# Altium footprint library TarabusLibrary.PcbLib: 591 footprints (part 35 of 37)
Each footprint in its own frame and in the unit in brackets; x right, y up, seen from the top. Pads: shape width x height; smd on the part's side, far side on the other; paste and mask are expansions set on the pad; w line width, h text height; cw(c..) or ccw(c..) is an arc to the next point about the centre after c.
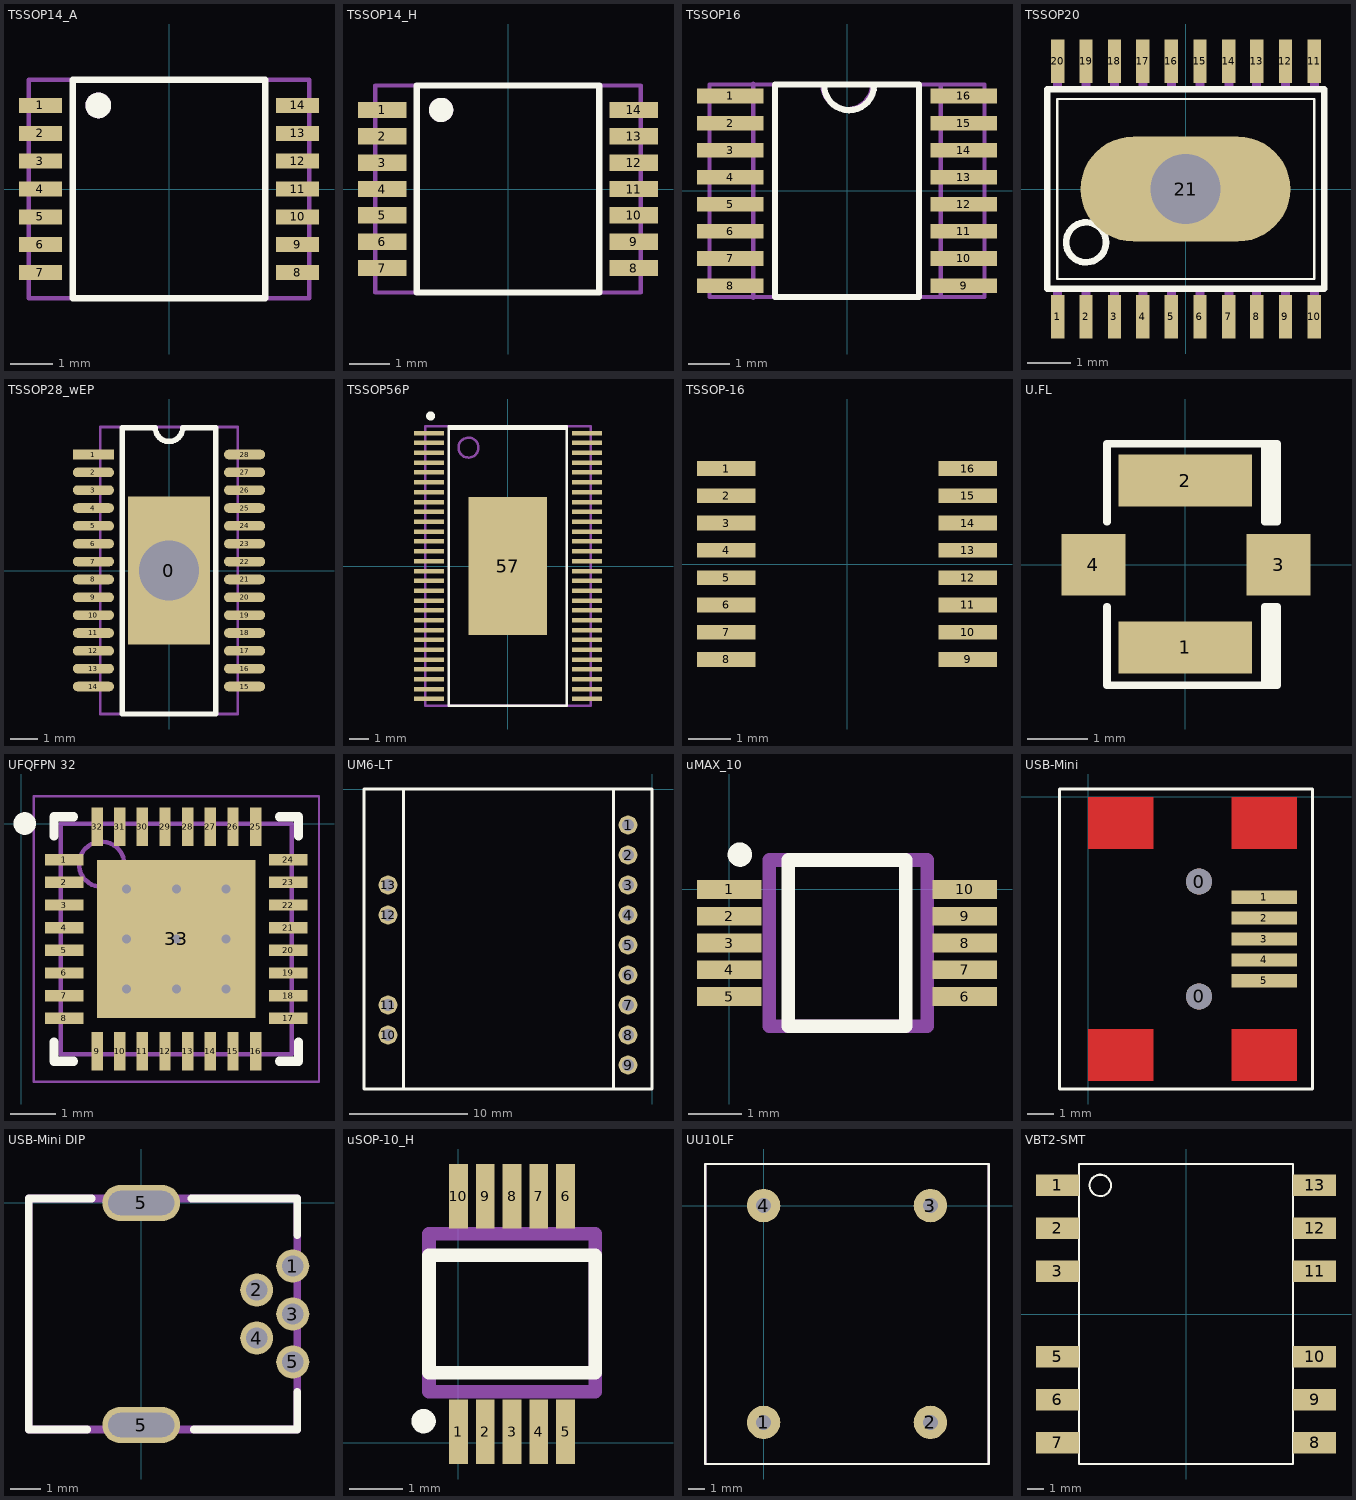
[diagram p34: the footprints below, top view; thin cyan lines are the x and y axes]

## TSSOP14_A [mm]
height 1.1
pads (14):
  rect 1x0.35 smd: 1(-3,1.95) 2(-3,1.3) 3(-3,0.65) 4(-3,0) 5(-3,-0.65) 6(-3,-1.3) 7(-3,-1.95) 8(3,-1.95) 9(3,-1.3) 10(3,-0.65) 11(3,0) 12(3,0.65) 13(3,1.3) 14(3,1.95)
Top Overlay:
  circle w0.3: c-1.65,1.95 r0.15
  lines w0.15: -2.25,-2.55 2.25,-2.55 2.25,2.55 -2.25,2.55 -2.25,-2.55
Mechanical 7:
  circle w0.3: c-1.65,1.95 r0.15
  lines w0.1: -2.25,-2.55 -2.25,2.55 ; 2.25,-2.55 2.25,2.55 ; -3.275,-2.55 -3.275,2.55 3.275,2.55 3.275,-2.55 -3.275,-2.55
Mechanical 10:
  text ".Designator" at -1.2,2.925 h0.8
  text ".Comment" at -1,-3.175 h0.6
3D body: height 1.1, standoff 0, extent -2.25,-2.55 2.25,2.55
3D body: height 0.5, standoff 0, extent -3.275,-2.55 -2.25,2.55
3D body: height 0.5, standoff 0, extent 2.25,-2.55 3.275,2.55

## TSSOP14_H [mm]
height 1.1
pads (14):
  rect 1.2x0.4 smd: 1(-3.1,1.95) 2(-3.1,1.3) 3(-3.1,0.65) 4(-3.1,0) 5(-3.1,-0.65) 6(-3.1,-1.3) 7(-3.1,-1.95) 8(3.1,-1.95) 9(3.1,-1.3) 10(3.1,-0.65) 11(3.1,0) 12(3.1,0.65) 13(3.1,1.3) 14(3.1,1.95)
Top Overlay:
  circle w0.3: c-1.65,1.95 r0.15
  lines w0.15: -2.25,-2.55 -2.25,2.55 2.25,2.55 2.25,-2.55 -2.25,-2.55
Mechanical 7:
  circle w0.3: c-1.65,1.95 r0.15
  lines w0.1: -2.25,-2.55 -2.25,2.55 ; 2.25,-2.55 2.25,2.55 ; -3.275,-2.55 3.275,-2.55 3.275,2.55 -3.275,2.55 -3.275,-2.55
Mechanical 10:
  text ".Comment" at -1,-3.175 h0.6
  text ".Designator" at -1.2,2.925 h0.8
3D body: height 0.5, standoff 0, extent 2.25,-2.55 3.275,2.55
3D body: height 0.5, standoff 0, extent -3.275,-2.55 -2.25,2.55
3D body: height 1.1, standoff 0, extent -2.25,-2.55 2.25,2.55

## TSSOP16 [mm]
height 1.99
pads (16):
  rect 1.6x0.35 smd: 1(-2.8,2.275) 2(-2.8,1.625) 3(-2.8,0.975) 4(-2.8,0.325) 5(-2.8,-0.325) 6(-2.8,-0.975) 7(-2.8,-1.625) 8(-2.8,-2.275) 9(2.8,-2.275) 10(2.8,-1.625) 11(2.8,-0.975) 12(2.8,-0.325) 13(2.8,0.325) 14(2.8,0.975) 15(2.8,1.625) 16(2.8,2.275)
Top Overlay:
  lines w0.15: -0.55,2.535 ccw(c0.05,2.535) 0.65,2.525 ; -1.725,-2.55 -1.725,2.55 1.725,2.55 1.725,-2.55 -1.725,-2.55
Mechanical 7:
  lines w0.1: -2.25,-2.575 -2.25,2.575 ; -0.6,2.56 ccw(c0,2.56) 0.6,2.55 ; 2.25,-2.55 2.25,2.55 ; -3.3,-2.55 -3.3,2.55 3.3,2.55 3.3,-2.55 -3.3,-2.55
Mechanical 10:
  text ".Designator" at -1.23,3.46 h0.8
  text ".Comment" at -0.67,-3.72 h0.6
3D body: height 1.99, standoff 0, extent -2.25,-2.55 2.25,2.525
3D body: height 0.75, standoff 0, extent -3.3,-2.55 -2.25,2.525
3D body: height 0.75, standoff 0, extent 2.25,-2.55 3.3,2.525

## TSSOP20 [mil]
pads (21):
  rect 12x39 smd: 1(-115.16,-114.87) 2(-89.57,-114.87) 3(-63.98,-114.87) 4(-38.39,-114.87) 5(-12.8,-114.87) 6(13,-114.87) 7(39,-114.87) 8(64,-114.87) 9(90,-114.87) 10(116,-114.87) 11(116,115) 12(90,115) 13(64,115) 14(39,115) 15(13,115) 16(-12.8,115) 17(-38.39,115) 18(-63.98,115) 19(-89.57,115) 20(-115.16,115)
  oval 189x94.5 hole 63: 21(0,0)
Top Overlay:
  circle w6: c-89.59,-48 r18
  lines w2: -115.59,-80.87 -115.59,81 116,81 116,-80.87 -115.59,-80.87
  lines w6: -124.59,-89.87 -124.59,90 125,90 125,-89.87 -124.59,-89.87
Mechanical 16:
  rectangle: -119.16,90 -111.16,123
  rectangle: -93.57,90 -85.57,123
  rectangle: -67.98,90 -59.98,123
  rectangle: -42.39,90 -34.39,123
  rectangle: -16.8,90 -8.8,123
  rectangle: 9,90 17,123
  rectangle: 35,90 43,123
  rectangle: 60,90 68,123
  rectangle: 86,90 94,123
  rectangle: 112,90 120,123
  rectangle: 112,-122.87 120,-89.87
  rectangle: 86,-122.87 94,-89.87
  rectangle: 60,-122.87 68,-89.87
  rectangle: 35,-122.87 43,-89.87
  rectangle: 9,-122.87 17,-89.87
  rectangle: -16.8,-122.87 -8.8,-89.87
  rectangle: -42.39,-122.87 -34.39,-89.87
  rectangle: -67.98,-122.87 -59.98,-89.87
  rectangle: -93.57,-122.87 -85.57,-89.87
  rectangle: -119.16,-122.87 -111.16,-89.87

## TSSOP28_wEP [mm] "TSSOP28_with_Exposed_Pad"
pads (29):
  rect 3x5.4 hole 2.2 mask+0.1: 0(0,0)
  rect 1.5x0.35 smd: 1(-2.75,4.225)
  oval 1.5x0.35 smd: 2(-2.75,3.575) 3(-2.75,2.925) 4(-2.75,2.275) 5(-2.75,1.625) 6(-2.75,0.975) 7(-2.75,0.325) 8(-2.75,-0.325) 9(-2.75,-0.975) 10(-2.75,-1.625) 11(-2.75,-2.275) 12(-2.75,-2.925) 13(-2.75,-3.575) 14(-2.75,-4.225) 15(2.75,-4.225) 16(2.75,-3.575) 17(2.75,-2.925) 18(2.75,-2.275) 19(2.75,-1.625) 20(2.75,-0.975) 21(2.75,-0.325) 22(2.75,0.325) 23(2.75,0.975) 24(2.75,1.625) 25(2.75,2.275) 26(2.75,2.925) 27(2.75,3.575) 28(2.75,4.225)
Top Overlay:
  lines w0.2: -1.7,-5.225 1.7,-5.225 1.7,5.2 0.5,5.2 cw(c0,5.2) -0.5,5.2 -1.7,5.2 -1.7,-5.225
Mechanical 7:
  lines w0.1: -2.5,-5.225 -2.5,5.225 2.5,5.225 2.5,-5.225 -2.5,-5.225
Mechanical 9:
  lines w0.1: -2.5,5.2 -2.5,-5.225 2.5,-5.225 2.5,5.225 -2.5,5.225
3D body: height 1.2, standoff 0.05, extent -2.5,-5.225 2.5,5.225

## TSSOP56P [mil]
pads (57):
  rect 60x9 smd: 1(-157.48,266) 2(-157.48,247) 3(-157.48,227) 4(-157.48,207) 5(-157.48,188) 6(-157.48,168) 7(-157.48,148) 8(-157.48,128) 9(-157.48,109) 10(-157.48,89) 11(-157.48,69) 12(-157.48,50) 13(-157.48,30) 14(-157.48,10) 15(-157.48,-9.84) 16(-157.48,-29.53) 17(-157.48,-49.21) 18(-157.48,-68.9) 19(-157.48,-88.58) 20(-157.48,-108.27) 21(-157.48,-127.95) 22(-157.48,-147.64) 23(-157.48,-167.32) 24(-157.48,-187.01) 25(-157.48,-206.69) 26(-157.48,-226.38) 27(-157.48,-246.06) 28(-157.48,-265.75) 29(158,-265.75) 30(158,-246.06) 31(158,-226.38) 32(158,-206.69) 33(158,-187.01) 34(158,-167.32) 35(158,-147.64) 36(158,-127.95) 37(158,-108.27) 38(158,-88.58) 39(158,-68.9) 40(158,-49.21) 41(158,-29.53) 42(158,-9.84) 43(158,10) 44(158,30) 45(158,50) 46(158,69) 47(158,89) 48(158,109) 49(158,128) 50(158,148) 51(158,168) 52(158,188) 53(158,207) 54(158,227) 55(158,247) 56(158,266)
  rect 157.48x275.59 smd: 57(0,0)
Top Overlay:
  circle w10: c-154.53,300.2 r3.94
  lines w5: -118.11,274.61 118.11,274.61 ; -118.11,-279.53 118.11,-279.53 118.11,279.53 -118.11,279.53 -118.11,-279.53
Mechanical 7:
  circle w5: c-78.74,237 r20
  lines w5: -165.35,-279.53 165.35,-279.53 165.35,279.53 -165.35,279.53 -165.35,-279.53
3D body: height 47.24, standoff 1.97, extent -125.98,-279.53 125.98,279.53
3D body: height 23.62, standoff 1.97, extent -165.35,-275.59 -125.98,275.59
3D body: height 23.62, standoff 1.97, extent 125.98,-275.59 165.35,275.59

## TSSOP-16 [mm]
pads (16):
  rect 1.4x0.35 smd: 1(-2.875,2.275) 2(-2.875,1.625) 3(-2.875,0.975) 4(-2.875,0.325) 5(-2.875,-0.325) 6(-2.875,-0.975) 7(-2.875,-1.625) 8(-2.875,-2.275) 9(2.875,-2.275) 10(2.875,-1.625) 11(2.875,-0.975) 12(2.875,-0.325) 13(2.875,0.325) 14(2.875,0.975) 15(2.875,1.625) 16(2.875,2.275)
3D body "TSSOP-16.STEP": height 1, standoff 0, extent -3.2,-2.5 3.2,2.5

## U.FL [mil] "U.FL"
pads (4):
  rect 87x34 smd: 1(0,-54.13) 2(0,55)
  rect 42x40 smd: 3(61,0) 4(-60.04,0)
Top Overlay:
  lines w5: -51.18,-27.56 -51.18,-78.74 52,-78.74 ; -51.18,28 -51.18,79 52,79 ; 56,-78.74 56,-27.56 ; 56,28 56,79 ; 52,-78.74 60,-78.74 60,-27.56 52,-27.56 52,-78.74 ; 52,79 60,79 60,28 52,28 52,79

## UFQFPN 32 [mm]
pads (33):
  rect 0.85x0.25 smd: 1(0.954,-0.79) 2(0.954,-1.29) 3(0.954,-1.79) 4(0.954,-2.29) 5(0.954,-2.79) 6(0.954,-3.29) 7(0.954,-3.79) 8(0.954,-4.29) 17(5.904,-4.29) 18(5.904,-3.79) 19(5.904,-3.29) 20(5.904,-2.79) 21(5.904,-2.29) 22(5.904,-1.79) 23(5.904,-1.29) 24(5.904,-0.79)
  rect 0.25x0.85 smd: 9(1.679,-5.015) 10(2.179,-5.015) 11(2.679,-5.015) 12(3.179,-5.015) 13(3.679,-5.015) 14(4.179,-5.015) 15(4.679,-5.015) 16(5.179,-5.015) 25(5.179,-0.065) 26(4.679,-0.065) 27(4.179,-0.065) 28(3.679,-0.065) 29(3.179,-0.065) 30(2.679,-0.065) 31(2.179,-0.065) 32(1.679,-0.065)
  rect 3.5x3.5 smd: 33(3.429,-2.54)
via 4.529,-3.64 diameter 0.5 hole 0.2
via 3.429,-3.64 diameter 0.5 hole 0.2
via 2.329,-3.64 diameter 0.5 hole 0.2
via 4.529,-2.54 diameter 0.5 hole 0.2
via 3.429,-2.54 diameter 0.5 hole 0.2
via 2.329,-2.54 diameter 0.5 hole 0.2
via 4.529,-1.44 diameter 0.5 hole 0.2
via 3.429,-1.44 diameter 0.5 hole 0.2
via 2.329,-1.44 diameter 0.5 hole 0.2
Top Overlay:
  circle w0.25: c0.079,0.01 r0.125
  lines w0.2: 0.729,-4.815 0.729,-5.24 1.154,-5.24 ; 0.729,-0.265 0.729,0.16 1.154,0.16 ; 5.704,-5.24 6.129,-5.24 6.129,-4.815 ; 5.704,0.16 6.129,0.16 6.129,-0.265
Mechanical 9:
  circle w0.1: c1.779,-0.89 r0.5
  lines w0.1: 0.879,-5.09 5.979,-5.09 5.979,0.01 0.879,0.01 0.879,-5.09
Mechanical 15:
  lines w0.05: 0.279,-5.69 6.579,-5.69 6.579,0.61 0.279,0.61 0.279,-5.69
  lines w0.1: 2.929,-2.54 3.929,-2.54 ; 3.429,-3.04 3.429,-2.04
3D body: height 0.6, standoff 0, extent 0.879,-5.09 5.979,0.01

## UM6-LT [mm]
pads (13):
  round 1.6 hole 1 mask+0: 1(-2.032,-3.048) 2(-2.032,-5.588) 3(-2.032,-8.128) 4(-2.032,-10.668) 5(-2.032,-13.208) 6(-2.032,-15.748) 7(-2.032,-18.288) 8(-2.032,-20.828) 9(-2.032,-23.368) 10(-22.352,-20.828) 11(-22.352,-18.288) 12(-22.352,-10.668) 13(-22.352,-8.128)
Top Overlay:
  lines w0.254: -21.05,-25.4 -21.05,0 ; -3.27,-25.4 -3.27,0 ; -24.384,-25.4 0,-25.4 0,0 -24.384,0 -24.384,-25.4
3D body: height 8, standoff 2, extent -24.384,-25.4 0,0

## uMAX_10 [mm]
pads (10):
  rect 1.2x0.35 smd mask+0: 1(0,0) 2(0,-0.5) 3(0,-1) 4(0,-1.5) 5(0,-2) 6(4.4,-2) 7(4.4,-1.5) 8(4.4,-1) 9(4.4,-0.5) 10(4.4,0)
Top Overlay:
  circle w0.254: c0.2,0.65 r0.1
  lines w0.254: 1.1,-2.55 3.3,-2.55 3.3,0.55 1.1,0.55 1.1,-2.55
Mechanical 7:
  lines w0.254: 0.75,-2.55 0.75,0.55 ; 0.8,-2.55 3.7,-2.55 3.7,0.55 0.8,0.55
3D body "SW3dPS-uMAX10.STEP": height 0.95, standoff 0, extent -0.3,-2.5 4.7,0.5

## USB-Mini [mm]
pads (7):
  round 1 hole 1 mask+0: 0(4.25,-7.65) 0(4.25,-3.25)
  rect 2.5x0.5 smd: 1(6.75,-3.85) 2(6.75,-4.65) 3(6.75,-5.45) 4(6.75,-6.25) 5(6.75,-7.05)
Top Layer:
  rectangle: 5.5,-2 8,0
  rectangle: 5.5,-10.9 8,-8.9
  rectangle: 0,-2 2.5,0
  rectangle: 0,-10.9 2.5,-8.9
Top Overlay:
  lines w0.1: -1.1,-11.2 -1.1,0.3 8.6,0.3 8.6,-11.2 -1.1,-11.2
3D body "User Library-usb_mini_smd.STEP": height 4.14, standoff -0.95, extent -1.7,-10.4 7.5,-0.5

## USB-Mini DIP [mm]
height 3.9
pads (7):
  round 1.1 hole 0.7: 1(5.05,-2.1) 2(3.85,-2.9) 3(5.05,-3.7) 4(3.85,-4.5) 5(5.05,-5.3)
  oval 2.6x1.2 hole 0.8 slot 2.2 at 0 deg: 5(0,-7.4) 5(0,0)
Top Overlay:
  lines w0.254: -1.8,-7.55 -3.75,-7.55 -3.75,0.15 -1.65,0.15 ; 1.675,0.15 5.2,0.15 5.2,-1.075 ; 1.75,-7.55 5.2,-7.55 5.2,-6.3
Mechanical 7:
  lines w0.254: -3.75,-7.55 -3.75,0.15 5.2,0.15 5.2,-7.55 -3.75,-7.55
3D body: height 3.9, standoff 0, extent -3.749,-7.549 5.199,0.149

## uSOP-10_H [mm]
pads (10):
  rect 0.35x1.2 smd mask+0: 1(0,0.2) 2(0.5,0.2) 3(1,0.2) 4(1.5,0.2) 5(2,0.2) 6(2,4.6) 7(1.5,4.6) 8(1,4.6) 9(0.5,4.6) 10(0,4.6)
Top Overlay:
  circle w0.254: c-0.65,0.4 r0.1
  lines w0.254: -0.55,1.3 2.55,1.3 2.55,3.5 -0.55,3.5 -0.55,1.3
Mechanical 7:
  lines w0.254: -0.55,0.95 2.55,0.95 ; -0.55,1 -0.55,3.9 2.55,3.9 2.55,1
3D body "User Library-msop-10.STEP": height 1.15, standoff 0, extent -0.5,-0.05 2.5,4.85

## UU10LF [mm]
pads (4):
  round 2 hole 0.9: 1(0,-13) 2(10,-13) 3(10,0) 4(0,0)
Top Overlay:
  lines w0.15: -3.5,-15.5 13.5,-15.5 13.5,2.5 -3.5,2.5 -3.5,-15.5
Mechanical 7:
  lines w0.15: -3.5,-15.5 -3.5,2.5 13.5,2.5 13.5,-15.5 -3.5,-15.5
Mechanical 10:
  text ".Designator" at 8.8,4.425 h0.8
  text ".Comment" at 9,3.5 h0.6
3D body: height 23, standoff 0, extent -3.5,-15.5 13.5,2.5

## VBT2-SMT [mm]
pads (12):
  rect 2.54x1.27 smd: 1(-7.62,7.62) 2(-7.62,5.08) 3(-7.62,2.54) 5(-7.62,-2.54) 6(-7.62,-5.08) 7(-7.62,-7.62) 8(7.62,-7.62) 9(7.62,-5.08) 10(7.62,-2.54) 11(7.62,2.54) 12(7.62,5.08) 13(7.62,7.62)
Top Overlay:
  circle w0.127: c-5.08,7.62 r0.635
  lines w0.127: -6.35,-8.89 -6.35,8.89 6.35,8.89 6.35,-8.89 -6.35,-8.89